# Altium footprint library Minh_Lib.PcbLib: 141 footprints (part 7 of 9)
Each footprint in its own frame and in the unit in brackets; x right, y up, seen from the top. Pads: shape width x height; smd on the part's side, far side on the other; paste and mask are expansions set on the pad; w line width, h text height; cw(c..) or ccw(c..) is an arc to the next point about the centre after c.
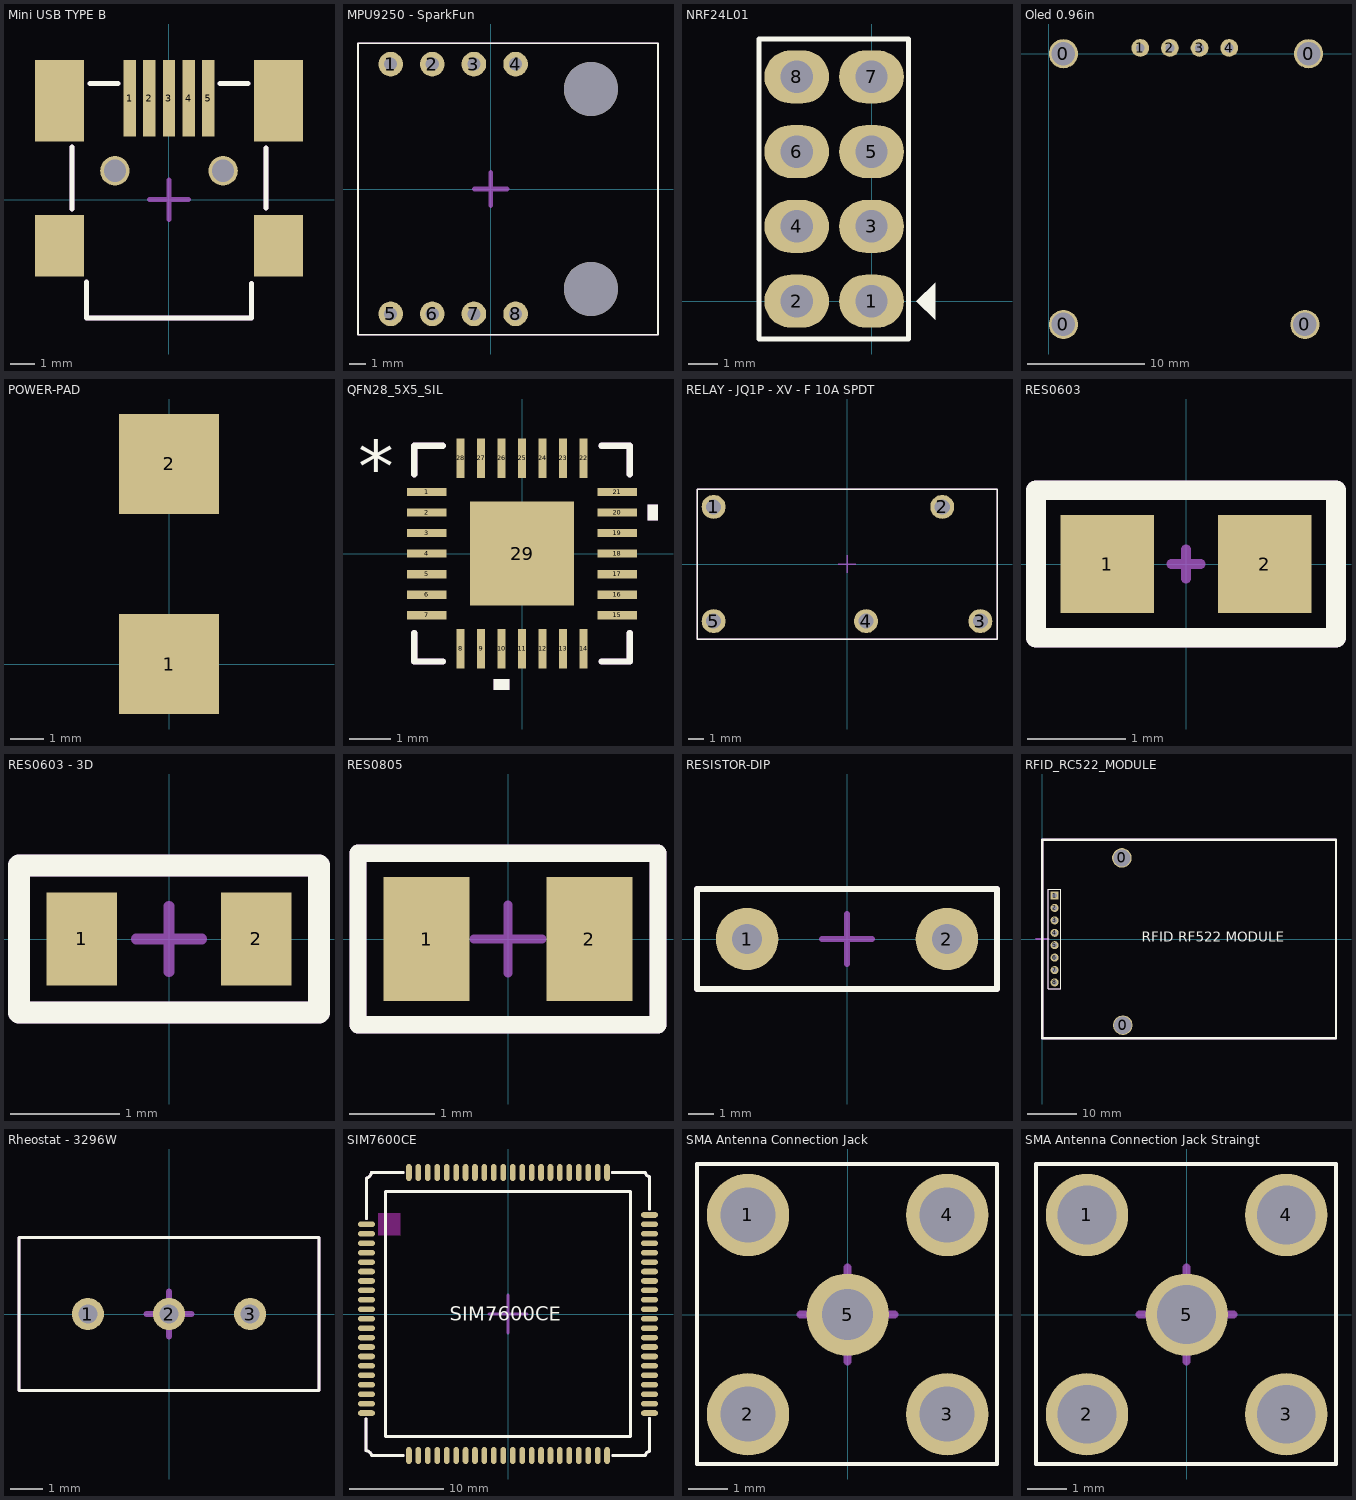
[diagram p6: the footprints below, top view; thin cyan lines are the x and y axes]

## Mini USB TYPE B [mm] "Mini USB TYPE B"
pads (11):
  rect 0.5x3.1 smd: 1(-1.6,4.125) 2(-0.8,4.125) 3(0,4.125) 4(0.8,4.125) 5(1.6,4.125)
  rect 2x2.5 smd: ""(-4.45,-1.875) ""(4.45,-1.875)
  rect 2x3.3 smd: ""(-4.45,4.025) ""(4.45,4.025)
  round 1.2 hole 0.9: ""(-2.2,1.175) ""(2.2,1.175)
Top Overlay:
  lines w0.2: -3.95,-0.385 -3.95,2.145 ; -3.35,-3.355 -3.35,-4.805 3.35,-4.805 3.35,-3.405 ; -3.22,4.725 -2.08,4.725 ; 2.08,4.725 3.22,4.725 ; 3.95,-0.345 3.95,2.095
Mechanical 13:
  lines w0.2: -3.95,-0.385 -3.95,2.145 ; -3.35,-3.355 -3.35,-4.805 3.35,-4.805 3.35,-3.405 ; -3.22,4.725 -2.08,4.725 ; 2.08,4.725 3.22,4.725 ; 3.95,-0.345 3.95,2.095
  text "'.Designator'" at -4.925,-4.125 h1.2
Mechanical 15:
  lines w0.2: -0.8,0 0,0 ; 0,-0.8 0,0 ; 0,0.8 0,0 ; 0.8,0 0,0
3D body "usb_mn_2_b_smd.stp": height 3.96, standoff -0.75, extent -4.951,-4.678 4.955,4.728

## MPU9250 - SparkFun [mm]
pads (10):
  round 1.5 hole 0.8: 1(-6.108,7.62) 2(-3.568,7.62) 3(-1.028,7.62) 4(1.512,7.62) 5(-6.108,-7.62) 6(-3.568,-7.62) 7(-1.028,-7.62) 8(1.512,-7.62)
  round 3.3 hole 3.3: ""(6.109,-6.096) ""(6.109,6.096)
Top Overlay:
  lines w0.1: -8.1,-8.9 10.2,-8.9 10.2,8.9 -8.1,8.9 -8.1,-8.9
Mechanical 13:
  lines w0.1: -8.1,-8.9 10.2,-8.9 10.2,8.9 -8.1,8.9 -8.1,-8.9
Mechanical 15:
  lines w0.3: -1,0 0,0 ; 0,-1 0,0 ; 0,1 0,0 ; 1,0 0,0
3D body "User Library-SMD Ceramic Capacitors_0603 (1608)_CD.step": height 9.8, standoff 9, extent -3.2,-3.85 -2.4,-2.25
3D body "User Library-SMD Ceramic Capacitors_0603 (1608)_CD.step": height 9.8, standoff 9, extent -1.05,-1.15 -0.25,0.45
3D body "CircuitWorks-CAPACITOR 0603.step": height 9.43, standoff 8.57, extent -6.65,2.37 -5.05,3.23
3D body "CircuitWorks-CAPACITOR 0603.step": height 9.43, standoff 8.57, extent -6.65,3.62 -5.05,4.48
3D body "CircuitWorks-CAPACITOR 0603.step": height 9.43, standoff 8.57, extent -6.65,4.77 -5.05,5.63
3D body "User Library-MPU9250.step": height 10, standoff 8.95, extent -5.06,-1.42 -2.04,1.6
3D body "Solidworks_MPU9250_SparkFun.STEP": height 8.6, standoff 7, extent -8.101,-8.89 10.212,8.89
3D body "4-Pin Header - Female - 2.54mm.step": height 5, standoff -3, extent -7.66,6.35 3,8.85
3D body "4x_Male_Pin_2.54_mm.STEP": height 10.09, standoff -1.01, extent -7.36,6.41 2.8,8.81
3D body "4-Pin Header - Female - 2.54mm.step": height 5, standoff -3, extent -7.62,-8.86 3.04,-6.36
3D body "4x_Male_Pin_2.54_mm.STEP": height 10.09, standoff -1.01, extent -7.373,-8.8 2.787,-6.4

## NRF24L01 [mm]
pads (8):
  oval 2.2x1.8 hole 1.1: 1(0,0) 2(-2.54,0) 3(0,2.54) 4(-2.54,2.54) 5(0,5.08) 6(-2.54,5.08) 7(0,7.62) 8(-2.54,7.62)
Top Overlay:
  region: 1.524,0 2.159,-0.635 2.159,0.635
  lines w0.178: -3.823,-1.283 -1.283,-1.283 1.257,-1.283 1.257,8.903 -3.823,8.903 -3.823,-1.283
3D body "NRF24l01_with_antenna.STEP": height 98.07, standoff -0.62, extent -71.8,-3.8 2.2,11.45
3D body "4-Pin Header - Female - 2.54mm.step": height 5, standoff -3, extent -1.3,-1.53 1.2,9.13
3D body "4-Pin Header - Female - 2.54mm.step": height 5, standoff -3, extent -3.8,-1.53 -1.3,9.13

## Oled 0.96in [mm] "128x64"
pads (8):
  round 2.5 hole 2: 0(1.25,-23.2) 0(1.25,0) 0(21.95,-23.2) 0(22.27,0)
  round 1.524 hole 0.762: 1(7.84,0.5) 2(10.38,0.5) 3(12.92,0.5) 4(15.46,0.5)
3D body "OLED_27x27_r2.SLDPRT": height 9.5, standoff 0.5, extent -2,-25.1 25.3,2.2

## POWER-PAD [mm]
pads (2):
  rect 3x3 smd: 1(0,0) 2(0,6)

## QFN28_5X5_SIL [mil]
pads (29):
  rect 38x8 smd: 1(-91.5,59.05) 2(-91.5,39.37) 3(-91.5,19.68) 4(-91.5,0) 5(-91.5,-19.68) 6(-91.5,-39.37) 7(-91.5,-59.06) 15(91.5,-59.06) 16(91.5,-39.37) 17(91.5,-19.68) 18(91.5,0) 19(91.5,19.68) 20(91.5,39.37) 21(91.5,59.06)
  rect 8x38 smd: 8(-59.06,-91.5) 9(-39.37,-91.5) 10(-19.68,-91.5) 11(0,-91.5) 12(19.68,-91.5) 13(39.37,-91.5) 14(59.06,-91.5) 22(59.06,91.5) 23(39.37,91.5) 24(19.68,91.5) 25(0,91.5) 26(-19.68,91.5) 27(-39.37,91.5) 28(-59.06,91.5)
  rect 100x100 smd paste-65.5 mask+0: 29(0,0)
Top Overlay:
  region: 120.5,46.87 130.5,46.87 130.5,31.87 120.5,31.87
  region: -12.19,-120.5 -27.18,-120.5 -27.18,-130.5 -12.19,-130.5
  lines w6: -103.5,-76.16 -103.5,-103.5 -76.16,-103.5 ; -103.5,76.16 -103.5,103.5 -76.16,103.5 ; 76.16,-103.5 103.5,-103.5 103.5,-76.16 ; 76.16,103.5 103.5,103.5 103.5,76.16
  text "*" at -157.48,59.06 h50
Top Paste:
  region: 50,-3.94 3.94,-3.94 3.94,-50 50,-50
  region: 50,50 3.94,50 3.94,3.94 50,3.94
  region: -3.94,-3.94 -50,-3.94 -50,-50 -3.94,-50
  region: -3.94,50 -50,50 -50,3.94 -3.94,3.94
Mechanical 13:
  region: 120.5,46.87 130.5,46.87 130.5,31.87 120.5,31.87
  region: -12.19,-120.5 -27.18,-120.5 -27.18,-130.5 -12.19,-130.5
  lines w6: -103.5,-76.16 -103.5,-103.5 -76.16,-103.5 ; -103.5,76.16 -103.5,103.5 -76.16,103.5 ; 76.16,-103.5 103.5,-103.5 103.5,-76.16 ; 76.16,103.5 103.5,103.5 103.5,76.16
  text "*" at -157.48,59.06 h50
Mechanical 15:
  lines w7.87: -11.81,0 0,0 ; 0,-11.81 0,0 ; 0,11.81 0,0 ; 11.81,0 0,0
3D body "QFN28_5X5_SIL.step": height 37.09, standoff 0, extent -98,-98 99,99
3D body: height 10, standoff 0, extent 0,0 10,10

## RELAY - JQ1P - XV - F 10A SPDT [mm]
pads (5):
  round 1.6 hole 1: 1(-8.89,3.81) 2(6.35,3.81) 3(8.89,-3.81) 4(1.27,-3.81) 5(-8.89,-3.81)
Top Overlay:
  lines w0.1: -10,-5 -10,5 10,5 10,-5 -10,-5
Mechanical 13:
  lines w0.1: -10,-5 -10,5 10,5 10,-5 -10,-5
  text "'.Designator'" at -9.625,-1.75 h1.2
Mechanical 15:
  lines w0.1: -0.6,0 0,0 ; 0,-0.6 0,0 ; 0,0.6 0,0 ; 0.6,0 0,0
3D body "JQ1P-5V-F.stp": height 16.1, standoff -5, extent -10,-5.02 10,4.98

## RES0603 [mm] "Resistor SMD 0603 ( imperal )"
pads (2):
  rect 0.95x1 smd: 1(-0.8,0) 2(0.8,0)
Top Overlay:
  lines w0.2: -1.525,-0.75 1.525,-0.75 1.525,0.75 -1.525,0.75 -1.525,-0.75
Mechanical 13:
  lines w0.2: -1.525,-0.75 -1.525,0.75 1.525,0.75 1.525,-0.75 -1.525,-0.75
  text "'.Designator'" at -1.325,-0.317 h0.7
Mechanical 15:
  lines w0.1: -0.15,0 0.15,0 ; 0,-0.15 0,0.15
3D body "User Library-CR1608-0603.step": height 0.46, standoff 0.01, extent -0.8,-0.4 0.8,0.4

## RES0603 - 3D [mm]
pads (2):
  rect 0.65x0.85 smd: 1(-0.8,0) 2(0.8,0)
Top Overlay:
  lines w0.2: -1.375,-0.675 1.375,-0.675 1.375,0.675 -1.375,0.675 -1.375,-0.675
Mechanical 13:
  lines w0.2: -1.375,-0.675 1.375,-0.675 1.375,0.675 -1.375,0.675 -1.375,-0.675
  text "'.Designator'" at -1.275,-0.408 h0.5
Mechanical 15:
  lines w0.1: -0.3,0 0.3,0 ; 0,-0.3 0,0.3
3D body "User Library-RESC1608X05N.STEP": height 0.45, standoff 0, extent -0.785,-0.425 0.765,0.425

## RES0805 [mm]
pads (2):
  rect 1x1.45 smd: 1(-0.95,0) 2(0.95,0)
Top Overlay:
  lines w0.2: -1.75,-1 1.75,-1 1.75,1 -1.75,1 -1.75,-1
Mechanical 13:
  lines w0.2: -1.75,-1 -1.75,1 1.75,1 1.75,-1 -1.75,-1
  text "'.Designator'" at -1.75,-0.567 h0.7
Mechanical 15:
  lines w0.1: -0.4,0 0.4,0 ; 0,-0.4 0,0.4
3D body "User Library-RESC2012X05N.STEP": height 0.45, standoff 0, extent -0.995,-0.625 1.005,0.625

## RESISTOR-DIP [mm]
pads (2):
  round 2.5 hole 1.2: 1(-4,0) 2(4,0)
Top Overlay:
  lines w0.254: -6,-2 -6,2 6,2 6,-2 -6,-2
Mechanical 13:
  lines w0.254: -6,-2 -6,2 6,2 6,-2 -6,-2
  text "'.Designator'" at -5.9,-1.667 h0.7
Mechanical 15:
  lines w0.254: -1,0 0,0 ; 0,-1 0,0 ; 0,1 0,0 ; 1,0 0,0

## RFID_RC522_MODULE [mm]
pads (10):
  round 4 hole 3.5: 0(16.3,16.6) 0(16.495,-17.65)
  rect 1.65x1.65 hole 1.02: 1(2.54,8.89)
  round 1.65 hole 1.02: 2(2.54,6.35) 3(2.54,3.81) 4(2.54,1.27) 5(2.54,-1.27) 6(2.54,-3.81) 7(2.54,-6.35) 8(2.54,-8.89)
Top Overlay:
  lines w0.2: 1.27,-10.16 1.27,10.16 3.81,10.16 3.81,-10.16 1.27,-10.16
  lines w0.5: 0,-20.32 0,20.32 60.135,20.32 60.135,-20.32 0,-20.32
  text "RFID RF522 MODULE" at 20.42,-0.535 h2
Mechanical 13:
  lines w0.2: 1.27,-10.16 1.27,10.16 3.81,10.16 3.81,-10.16 1.27,-10.16
  lines w0.5: 0,-20.32 0,20.32 60.135,20.32 60.135,-20.32 0,-20.32
  text "RFID RF522 MODULE" at 20.42,-0.535 h2
Mechanical 15:
  lines w0.4: -1.27,0 0,0 ; 0,-1.27 0,0 ; 0,1.27 0,0 ; 1.27,0 0,0
3D body "zl305-8s_p2-54_l20-82_w2-5_h5.stp": height 5.55, standoff -2.45, extent 1.27,-10.41 3.77,10.41
3D body "RFID.STEP": height 17.3, standoff 5.76, extent 0.314,-20.444 60.314,19.556

## Rheostat - 3296W [mm]
pads (3):
  round 1 hole 0.6: 1(-2.54,0) 2(0,0) 3(2.54,0)
Top Overlay:
  lines w0.1: -4.7,-2.4 4.7,-2.4 4.7,2.4 -4.7,2.4 -4.7,-2.4
Mechanical 13:
  lines w0.1: -4.7,-2.4 4.7,-2.4 4.7,2.4 -4.7,2.4 -4.7,-2.4
  text "'.Designator'" at -4.4,-1.7 h1.2
Mechanical 15:
  lines w0.2: -0.7,0 0,0 ; 0,-0.7 0,0 ; 0,0.7 0,0 ; 0.7,0 0,0
3D body "3296W.stp": height 11.3, standoff -2.6, extent -4.7,-2.4 4.7,2.4

## SIM7600CE [mm] "SIM7600CE-M1S 4G LTE-CAT 4 GPS SIMCOM MODULE"
pads (87):
  oval 1.8x0.6 smd: 1(-15,9.5) 2(-15,8.5) 3(-15,7.5) 4(-15,6.5) 5(-15,5.5) 6(-15,4.5) 7(-15,3.5) 8(-15,2.5) 9(-15,1.5) 10(-15,0.5) 11(-15,-0.5) 12(-15,-1.5) 13(-15,-2.5) 14(-15,-3.5) 15(-15,-4.5) 16(-15,-5.5) 17(-15,-6.5) 18(-15,-7.5) 19(-15,-8.5) 20(-15,-9.5) 41(15,-9.5) 42(15,-8.5) 43(15,-7.5) 44(15,-6.5) 45(15,-5.5) 46(15,-4.5) 47(15,-3.5) 48(15,-2.5) 49(15,-1.5) 50(15,-0.5) 51(15,0.5) 52(15,1.5) 53(15,2.5) 54(15,3.5) 55(15,4.5) 56(15,5.5) 57(15,6.5) 58(15,7.5) 59(15,8.5) 60(15,9.5) 81(-15,-10.5) 82(15,-10.5) 85(15,10.5)
  oval 0.6x1.8 smd: 21(-9.5,-15) 22(-8.5,-15) 23(-7.5,-15) 24(-6.5,-15) 25(-5.5,-15) 26(-4.5,-15) 27(-3.5,-15) 28(-2.5,-15) 29(-1.5,-15) 30(-0.5,-15) 31(0.5,-15) 32(1.5,-15) 33(2.5,-15) 34(3.5,-15) 35(4.5,-15) 36(5.5,-15) 37(6.5,-15) 38(7.5,-15) 39(8.5,-15) 40(9.5,-15) 61(9.5,15) 62(8.5,15) 63(7.5,15) 64(6.5,15) 65(5.5,15) 66(4.5,15) 67(3.5,15) 68(2.5,15) 69(1.5,15) 70(0.5,15) 71(-0.5,15) 72(-1.5,15) 73(-2.5,15) 74(-3.5,15) 75(-4.5,15) 76(-5.5,15) 77(-6.5,15) 78(-7.5,15) 79(-8.5,15) 80(-9.5,15) 83(10.5,-15) 84(-10.5,-15) 86(-10.5,15) 87(10.5,15)
Top Overlay:
  lines w0.3: -15.05,-11.1 -15.05,-14.5 cw(c-15.05,-15.1) -14.462,-14.982 ; -15,10.1 -15,14.412 ; -14.982,14.412 ccw(c-15.1,15) -14.5,15 -11.1,15 ; -14.462,-15 -11.1,-15 ; 11.05,15 14.573,15 ccw(c15,15) 15,14.573 15,11.1 ; 11.1,-15 14.573,-15 cw(c15,-15) 15,-14.573 15,-11.05 ; -13,-13 13,-13 13,13 -13,13 -13,-13
  text "SIM7600CE" at -6.2,-0.7 h1.52
Keep-Out Layer:
  rectangle: -13.8,8.3 -11.4,10.7
Mechanical 13:
  text "'.Designator'" at -12.8,-11.7 h3
Mechanical 15:
  lines w0.3: -15.05,-11.1 -15.05,-14.5 cw(c-15.05,-15.1) -14.462,-14.982 ; -15,10.1 -15,14.412 ; -14.982,14.412 ccw(c-15.1,15) -14.5,15 -11.1,15 ; -14.462,-15 -11.1,-15 ; -2,0 0,0 ; 0,-2 0,0 ; 0,2 0,0 ; 2,0 0,0 ; 11.05,15 14.573,15 ccw(c15,15) 15,14.573 15,11.1 ; 11.1,-15 14.573,-15 cw(c15,-15) 15,-14.573 15,-11.05 ; -13,-13 13,-13 13,13 -13,13 -13,-13
3D body "User Library-User Library-SIM7600C.STEP": height 3.17, standoff 0, extent -15,-15 15,15

## SMA Antenna Connection Jack [mm]
pads (5):
  round 2.1 hole 1.4: 1(-2.54,2.54) 2(-2.54,-2.54) 3(2.54,-2.54) 4(2.54,2.54)
  round 2.1 hole 1.3: 5(0,0)
Top Overlay:
  lines w0.1: -3.84,-3.81 3.81,-3.81 3.81,3.84 -3.84,3.84 -3.84,-3.81
Mechanical 13:
  text "'.Designator'" at -3,-2.6 h0.9
Mechanical 15:
  lines w0.1: -3.84,-3.81 3.81,-3.81 3.81,3.84 -3.84,3.84 -3.84,-3.81
  lines w0.2: -1.2,0 0,0 ; 0,-1.2 0,0 ; 0,1.2 0,0 ; 1.2,0 0,0
3D body "antenna_WiFi_RP-SMA_conn.step": height 102, standoff 1.5, extent -5.45,5.491 5.66,36.389
3D body "TE_5-1814400-1.STEP": height 10.43, standoff -2.8, extent -3.163,-3.15 3.163,11.05

## SMA Antenna Connection Jack Straingt [mm]
pads (5):
  round 2.1 hole 1.5: 1(-2.54,2.54) 2(-2.54,-2.54) 3(2.54,-2.54) 4(2.54,2.54) 5(0,0)
Top Overlay:
  lines w0.1: -3.84,-3.81 3.81,-3.81 3.81,3.84 -3.84,3.84 -3.84,-3.81
Mechanical 13:
  text "'.Designator'" at -3,-2.6 h0.9
Mechanical 15:
  lines w0.1: -3.84,-3.81 3.81,-3.81 3.81,3.84 -3.84,3.84 -3.84,-3.81
  lines w0.2: -1.2,0 0,0 ; 0,-1.2 0,0 ; 0,1.2 0,0 ; 1.2,0 0,0
3D body "TE_5-1814832-1.STEP": height 9.6, standoff -3.9, extent -3.2,-3.2 3.2,3.2
3D body "80mm antenna SMA.SLDPRT": height 85, standoff 5, extent -5.093,-5.2 4.893,4.797